# Altium footprint library HW_HOLLAND_NCDM_MONITOR_R1.PcbLib: 472 footprints (part 13 of 30)
Each footprint in its own frame and in the unit in brackets; x right, y up, seen from the top. Pads: shape width x height; smd on the part's side, far side on the other; paste and mask are expansions set on the pad; w line width, h text height; cw(c..) or ccw(c..) is an arc to the next point about the centre after c.
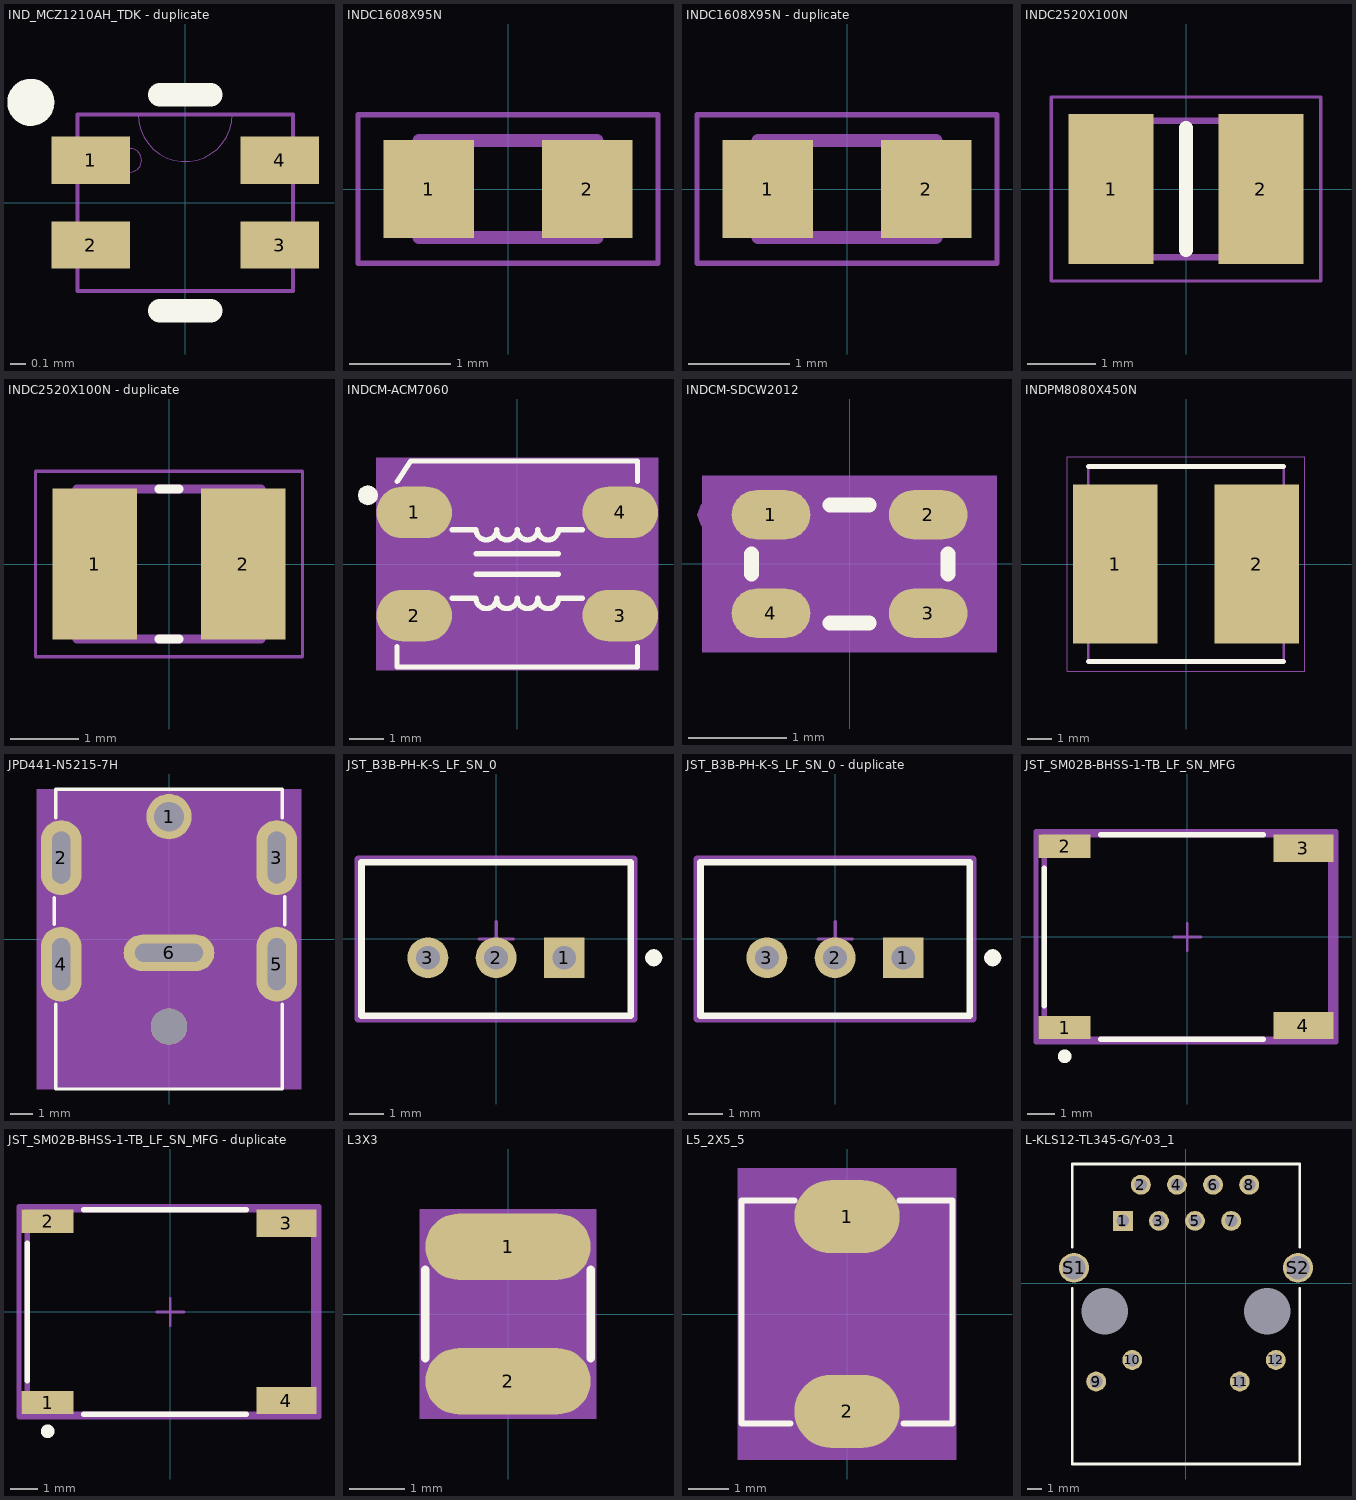
[diagram p12: the footprints below, top view; thin cyan lines are the x and y axes]

## IND_MCZ1210AH_TDK - duplicate [mil]
pads (4):
  rect 20x12 smd paste-6 mask+0: 1(-24.11,10.83) 2(-24.11,-10.83) 3(24.11,-10.83) 4(24.11,10.83)
Top Overlay:
  circle w6: c-39.37,25.59 r3
  lines w6: -6.52,-27.5 6.52,-27.5 ; -6.52,27.5 6.52,27.5
Mechanical 13:
  circle w0: c-14.11,10.83 r3
  lines w0: -12,22.5 ccw(c0,22.5) 12,22.5
  lines w1: -27.5,-22.5 -27.5,22.5 27.5,22.5 27.5,-22.5 -27.5,-22.5
3D body "IND_MCZ1210AH_TDK.step": height 24.09, standoff 0, extent -27.48,-22.52 27.48,22.52

## INDC1608X95N [mm]
pads (2):
  rect 0.9x0.97 smd: 1(-0.785,0) 2(0.785,0)
Mechanical 13:
  lines w0.127: -0.88,-0.48 -0.88,0.48 0.88,0.48 0.88,-0.48 -0.88,-0.48
Mechanical 15:
  lines w0.05: -1.485,-0.735 -1.485,0.735 1.485,0.735 1.485,-0.735 -1.485,-0.735
3D body "step_temp.STEP": height 0.95, standoff 0, extent -0.8,-0.4 0.8,0.4

## INDC1608X95N - duplicate [mm]
pads (2):
  rect 0.9x0.97 smd: 1(-0.785,0) 2(0.785,0)
Mechanical 13:
  lines w0.127: -0.88,-0.48 -0.88,0.48 0.88,0.48 0.88,-0.48 -0.88,-0.48
Mechanical 15:
  lines w0.05: -1.485,-0.735 -1.485,0.735 1.485,0.735 1.485,-0.735 -1.485,-0.735
3D body "step_temp.STEP": height 0.95, standoff 0, extent -0.8,-0.4 0.8,0.4

## INDC2520X100N [mm]
height 0.52
pads (2):
  rect 1.25x2.2 smd: 1(-1.1,0) 2(1.1,0)
Top Overlay:
  lines w0.2: 0,-0.9 0,0.9
Mechanical 13:
  lines w0.1: -1.25,-1 -1.25,1 1.25,1 1.25,-1 -1.25,-1
Mechanical 15:
  lines w0.05: -1.975,-1.35 -1.975,1.35 1.975,1.35 1.975,-1.35 -1.975,-1.35
3D body "LQM2HPN2R2MG0L.stp": height 1, standoff 0, extent -1.25,-1 1.25,1

## INDC2520X100N - duplicate [mm]
pads (2):
  rect 1.24x2.22 smd: 1(-1.09,0) 2(1.09,0)
Top Overlay:
  lines w0.127: -0.15,-1.1 0.15,-1.1 ; -0.15,1.1 0.15,1.1
Mechanical 13:
  lines w0.127: -1.35,-1.1 1.35,-1.1 1.35,1.1 -1.35,1.1 -1.35,-1.1
Mechanical 15:
  lines w0.05: -1.958,-1.358 1.958,-1.358 1.958,1.358 -1.958,1.358 -1.958,-1.358
3D body "step_temp.STEP": height 1, standoff 0, extent -1.25,-1 1.25,1

## INDCM-ACM7060 [mm]
pads (4):
  oval 2.2x1.5 smd: 1(-3,1.5) 2(-3,-1.5) 3(3,-1.5) 4(3,1.5)
Top Overlay:
  dashed: -4.35,1.712 -4.24,1.734 -4.146,1.796 -4.084,1.89 -4.062,2 -4.084,2.11 -4.105,2.142 -4.146,2.204 -4.24,2.266 -4.35,2.288 -4.46,2.266 -4.554,2.204 -4.595,2.142 -4.616,2.11 -4.638,2 -4.616,1.89 -4.554,1.796 -4.46,1.734
  lines w0.152: -3.5,-2.4 -3.5,-3 3.5,-3 3.5,-2.4 ; -3.5,2.4 -3.1,3 3.5,3 3.5,2.4 ; -1.9,-1 -1.2,-1 ccw(c-0.9,-1) -0.6,-1 ccw(c-0.3,-1) 0,-1 ccw(c0.3,-1) 0.6,-1 ccw(c0.9,-1) 1.2,-1 1.9,-1 ; -1.9,1 -1.2,1 ccw(c-0.9,1) -0.6,1 ccw(c-0.3,1) 0,1 ccw(c0.3,1) 0.6,1 ccw(c0.9,1) 1.2,1 1.9,1 ; -1.2,-0.3 1.2,-0.3 ; -1.2,0.3 1.2,0.3
Top Assembly:
  lines w0.025: -3.5,-3 -3.5,3 3.5,3 3.5,-3 -3.5,-3
Top 3D Body:
  region: -4.1,3.1 4.1,3.1 4.1,-3.1 -4.1,-3.1
Mechanical 17:
  text "4" at 3,1.683 h0.46
  text "3" at 3,-1.317 h0.46
  text "2" at -3,-1.317 h0.46
  text "1" at -3,1.683 h0.46
3D body: height 3.81, standoff 0, extent -4.1,-3.1 4.1,3.1

## INDCM-SDCW2012 [mil]
pads (4):
  oval 31.5x19.69 smd: 1(-31.5,19.75) 2(31.5,19.75) 3(31.5,-19.75) 4(-31.5,-19.75)
Top Overlay:
  lines w6: -39.37,-3.94 -39.37,3.94 ; -7.87,-23.62 7.87,-23.62 ; -7.87,23.62 7.87,23.62 ; 39.37,-3.94 39.37,3.94
  text ".Designator" at 24.99,8.33 h25
Top Assembly:
  dashed: -55.12,25.71 -59.38,23.94 -61.14,19.68 -59.98,16.88 -59.38,15.43 -55.12,13.66 -50.86,15.43 -50.26,16.88 -49.09,19.68 -50.86,23.94
  lines w1: -39.37,-23.62 39.37,-23.62 39.37,23.62 -39.37,23.62 -39.37,-23.62
Top 3D Body:
  region: -59.06,35.43 -59.06,-35.43 59.06,-35.43 59.06,35.43
Mechanical 17:
  text "3" at 41,-27 h36
  text "4" at -22,-28 h36
  text "1" at -18,8 h36
  text "2" at 36,8 h36
3D body: height 150, standoff 0, extent -59.06,-35.43 59.06,35.43

## INDPM8080X450N [mm]
pads (2):
  rect 3.45x6.5 smd: 1(-2.9,0) 2(2.9,0)
Top Overlay:
  lines w0.2: -4,-4 4,-4 ; -4,4 4,4
Mechanical 13:
  lines w0.1: -4,-4 4,-4 4,4 -4,4 -4,-4
Mechanical 15:
  lines w0.05: -4.875,-4.4 4.875,-4.4 4.875,4.4 -4.875,4.4 -4.875,-4.4
3D body "SRN8040TA-181M.stp": height 4.5, standoff 0, extent -4,-4 4,4

## JPD441-N5215-7H [mm]
pads (7):
  round 2 hole 1.3: 1(-0.005,5.39)
  oval 1.8x3.3 hole 2.3 slot 0.8 at 0 deg: 2(-4.755,3.59) 3(4.745,3.59) 4(-4.755,-1.11) 5(4.745,-1.11)
  oval 4x1.6 hole 0.8 slot 3 at 0 deg: 6(-0.005,-0.61)
  round 1.6 hole 1.6 unplated: ""(-0.005,-3.86)
Top Overlay:
  lines w0.152: -5.055,0.66 -5.055,1.82 ; -5.005,-2.87 -5.005,-6.61 4.995,-6.61 4.995,-2.87 ; -5.005,5.35 -5.005,6.59 4.995,6.59 4.995,5.34 ; 5.095,0.62 5.095,1.87
  text ".Designator" at -0.635,-0.212 h0.64
Top Assembly:
  lines w0.025: -5.055,0.65 -5.055,1.84 ; -5.005,-2.86 -5.005,-6.61 4.995,-6.61 4.995,-2.86 ; -5.005,5.34 -5.005,6.59 4.995,6.59 4.995,6.39 4.995,5.33 ; 5.095,0.6 5.095,1.87
Top 3D Body:
  region: -5.825,6.61 -5.825,-6.61 5.825,-6.61 5.825,6.61
Mechanical 17:
  text "5" at 4.323,-1.41 h0.46
  text "4" at -5.074,-1.29 h0.46
  text "3" at 4.493,3.303 h0.46
  text "2" at -5.034,3.393 h0.46
  text "6" at -1.641,-0.61 h0.46
  text "1" at -0.061,5.05 h0.46
3D body: height 3.81, standoff 0, extent -5.825,-6.61 5.825,6.61

## JST_B3B-PH-K-S_LF_SN_0 [mm]
pads (3):
  rect 1.2x1.2 hole 0.7 paste-2539.97 mask+0: 1(2,-0.55)
  round 1.2 hole 0.7 paste-2539.97 mask+0: 2(0,-0.55) 3(-2,-0.55)
Top Overlay:
  circle w0.25: c4.625,-0.55 r0.125
  lines w0.2: -3.95,-2.25 3.95,-2.25 3.95,2.25 -3.95,2.25 -3.95,-2.25
Top Courtyard:
  lines w0.2: -4.05,-2.35 4.05,-2.35 4.05,2.35 -4.05,2.35 -4.05,-2.35
  text ".Designator" at 0,0 h1.25
Mechanical 12:
  lines w0.15: -3.95,-2.25 3.95,-2.25 3.95,2.25 -3.95,2.25 -3.95,-2.25
Mechanical 15:
  lines w0.1: -0.5,0 0.5,0 ; 0,-0.5 0,0.5
  lines w0.2: -4.05,-2.35 4.05,-2.35 4.05,2.35 -4.05,2.35 -4.05,-2.35
3D body "Conn_JST_B3B-PH-K-S_LF_SN_eec.STEP": height 0.25, standoff 0, extent -4.05,-2.35 4.05,2.35

## JST_B3B-PH-K-S_LF_SN_0 - duplicate [mm]
height 0.52
pads (3):
  rect 1.2x1.2 hole 0.7 paste-2539.97 mask+0: 1(2,-0.55)
  round 1.2 hole 0.7 paste-2539.97 mask+0: 2(0,-0.55) 3(-2,-0.55)
Top Overlay:
  circle w0.25: c4.625,-0.55 r0.125
  lines w0.2: -3.95,-2.25 -3.95,2.25 3.95,2.25 3.95,-2.25 -3.95,-2.25
Top Courtyard:
  lines w0.2: -4.05,-2.35 -4.05,2.35 4.05,2.35 4.05,-2.35 -4.05,-2.35
  text ".Designator" at 0,0 h1
Mechanical 12:
  lines w0.15: -3.95,-2.25 -3.95,2.25 3.95,2.25 3.95,-2.25 -3.95,-2.25
Mechanical 15:
  lines w0.1: -0.5,0 0.5,0 ; 0,-0.5 0,0.5
  lines w0.2: -4.05,-2.35 -4.05,2.35 4.05,2.35 4.05,-2.35 -4.05,-2.35
3D body "Conn_JST_B3B-PH-K-S_LF_SN_eec.STEP": height 0.25, standoff 0, extent -4.05,-2.35 4.05,2.35

## JST_SM02B-BHSS-1-TB_LF_SN_MFG [mm]
pads (4):
  rect 1.9x0.85 smd paste+0 mask+0: 1(-4.5,-3.325) 2(-4.5,3.325)
  rect 2.2x1 smd paste+0 mask+0: 3(4.25,3.25) 4(4.25,-3.25)
Top Overlay:
  circle w0.25: c-4.5,-4.375 r0.125
  lines w0.2: -5.25,-2.525 -5.25,2.525 ; -3.175,-3.75 2.775,-3.75 ; -3.175,3.75 2.775,3.75
Top Courtyard:
  lines w0.2: -5.55,-3.85 -5.55,3.85 5.45,3.85 5.45,-3.85 -5.55,-3.85
  text ".Designator" at -0.05,0 h1
Mechanical 12:
  lines w0.2: -5.25,-3.75 -5.25,3.75 5.25,3.75 5.25,-3.75 -5.25,-3.75
Mechanical 15:
  lines w0.1: -0.5,0 0.5,0 ; 0,-0.5 0,0.5
  lines w0.2: -5.55,-3.85 -5.55,3.85 5.45,3.85 5.45,-3.85 -5.55,-3.85
3D body "Conn_JST_SM02B-BHSS-1-TB_LF_SN_eec.STEP": height 3.3, standoff 0, extent -5.25,-3.75 5.25,3.75

## JST_SM02B-BHSS-1-TB_LF_SN_MFG - duplicate [mm]
pads (4):
  rect 1.9x0.85 smd paste+0 mask+0: 1(-4.5,-3.325) 2(-4.5,3.325)
  rect 2.2x1 smd paste+0 mask+0: 3(4.25,3.25) 4(4.25,-3.25)
Top Overlay:
  circle w0.25: c-4.5,-4.375 r0.125
  lines w0.2: -5.25,-2.525 -5.25,2.525 ; -3.175,-3.75 2.775,-3.75 ; -3.175,3.75 2.775,3.75
Top Courtyard:
  lines w0.2: -5.55,-3.85 -5.55,3.85 5.45,3.85 5.45,-3.85 -5.55,-3.85
  text ".Designator" at -0.05,0 h1
Mechanical 12:
  lines w0.2: -5.25,-3.75 -5.25,3.75 5.25,3.75 5.25,-3.75 -5.25,-3.75
Mechanical 15:
  lines w0.1: -0.5,0 0.5,0 ; 0,-0.5 0,0.5
  lines w0.2: -5.55,-3.85 -5.55,3.85 5.45,3.85 5.45,-3.85 -5.55,-3.85
3D body "Conn_JST_SM02B-BHSS-1-TB_LF_SN_eec.STEP": height 3.3, standoff 0, extent -5.25,-3.75 5.25,3.75

## L3X3 [mm]
pads (2):
  oval 3x1.2 smd: 1(0,1.22) 2(0,-1.22)
Top Overlay:
  lines w0.152: -1.5,-0.8 -1.5,0.8 ; 1.5,-0.8 1.5,0.8
  text ".Designator" at 0.635,0.212 h0.64
Top Assembly:
  lines w0.025: -1.5,-1.5 1.5,-1.5 1.5,1.5 -1.5,1.5 -1.5,-1.5
Top 3D Body:
  region: -1.6,1.9 1.6,1.9 1.6,-1.9 -1.6,-1.9
Mechanical 17:
  text "1" at 0,0.204 h1.27
  text "2" at 0,-2.236 h1.27
3D body: height 3.81, standoff 0, extent -1.6,-1.9 1.6,1.9

## L5_2X5_5 [mm]
pads (2):
  oval 2.6x1.8 smd: 1(0,2.4) 2(0,-2.4)
Top Overlay:
  lines w0.152: -1.4,-2.7 -2.6,-2.7 -2.6,2.8 -1.3,2.8 ; 1.3,2.8 2.6,2.8 2.6,-2.7 1.4,-2.7
  text ".Designator" at 0.635,0.212 h0.64
Top Assembly:
  lines w0.025: -2.6,-2.75 2.6,-2.75 2.6,2.75 -2.6,2.75 -2.6,-2.75
Top 3D Body:
  region: -2.7,3.6 2.7,3.6 2.7,-3.6 -2.7,-3.6
Mechanical 17:
  text "1" at 0,1.983 h1.04
  text "2" at 0,-2.817 h1.04
3D body: height 3.81, standoff 0, extent -2.7,-3.6 2.7,3.6

## L-KLS12-TL345-G/Y-03_1 [mm] "Connector, 12-Leads, Body 17.27x15.75mm, Pitch 1.016mm"
height 14.22
pads (16):
  rect 1.4x1.4 hole 0.89: 1(-4.445,4.38)
  round 1.4 hole 0.89: 2(-3.175,6.92) 3(-1.905,4.38) 4(-0.635,6.92) 5(0.635,4.38) 6(1.905,6.92) 7(3.175,4.38) 8(4.445,6.92) 9(-6.32,-6.92) 10(-3.78,-5.4) 11(3.78,-6.92) 12(6.32,-5.4)
  round 0 hole 3.251 unplated: MH1(-5.715,-1.97) MH2(5.715,-1.97)
  round 2.1 hole 1.63: S1(-7.875,1.08) S2(7.875,1.08)
Top Overlay:
  lines w0.203: -8,-0.382 -8,-12.72 8,-12.72 8,-0.382 ; -8,2.541 -8,8.38 8,8.38 8,2.541
3D body "User Library-KLS12-TL076.STEP": height 16.2, standoff -3.1, extent -9.85,-13.3 9.9,8.6